# Altium footprint library Pcblib.PcbLib: 281 footprints (part 10 of 18)
Each footprint in its own frame and in the unit in brackets; x right, y up, seen from the top. Pads: shape width x height; smd on the part's side, far side on the other; paste and mask are expansions set on the pad; w line width, h text height; cw(c..) or ccw(c..) is an arc to the next point about the centre after c.
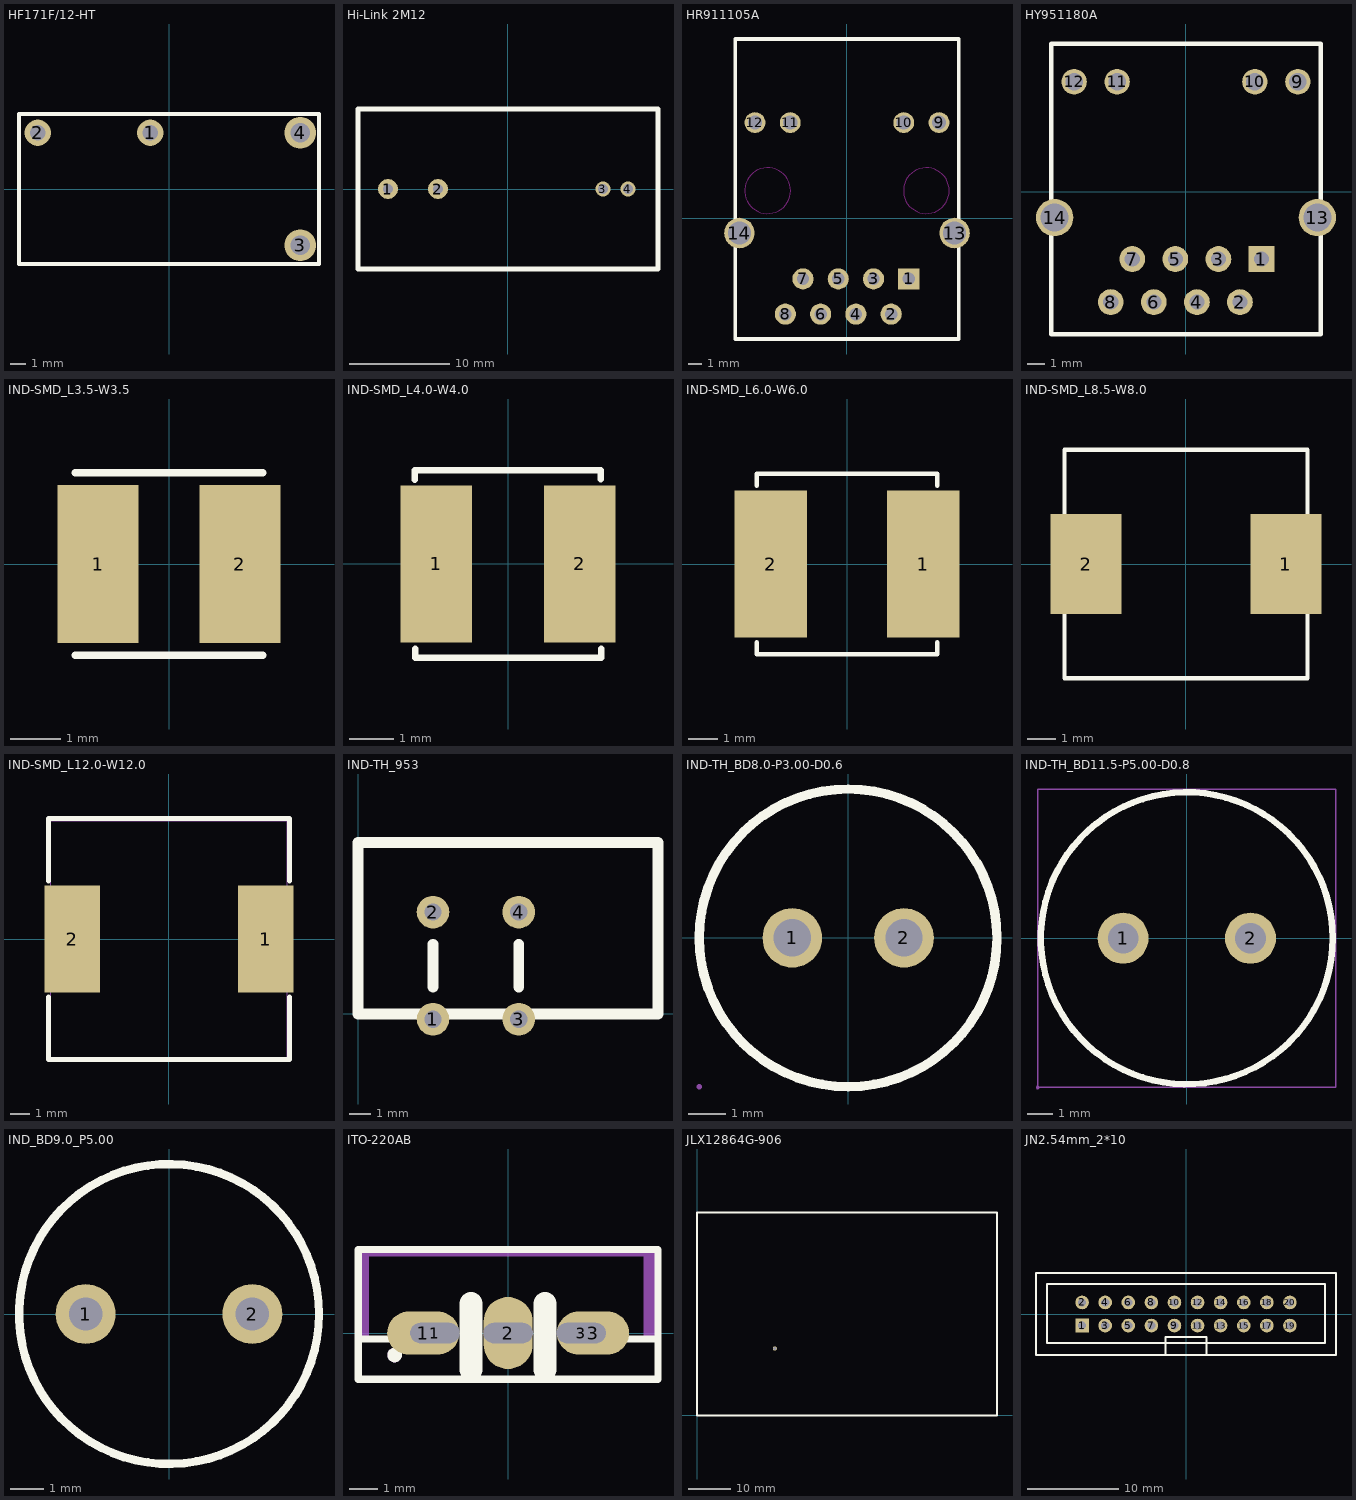
[diagram p9: the footprints below, top view; thin cyan lines are the x and y axes]

## HF171F/12-HT [mm] "8A 277AC"
pads (4):
  round 1.75 hole 1: 1(-1.25,3.75) 2(-8.75,3.75)
  round 2.1 hole 1.3: 3(8.75,-3.75) 4(8.75,3.75)
Top Overlay:
  lines w0.254: -10,-5 10,-5 10,5 -10,5 -10,-5

## Hi-Link 2M12 [mm]
height 19
pads (4):
  round 2 hole 1: 1(-12,0) 2(-7,0)
  round 1.5 hole 1: 3(9.5,0) 4(12,0)
Top Overlay:
  lines w0.508: -15,-8 15,-8 15,8 -15,8 -15,-8

## HR911105A [mm]
pads (14):
  rect 1.524x1.524 hole 0.889: 1(4.45,-4.355)
  round 1.524 hole 0.889: 2(3.18,-6.895) 3(1.91,-4.355) 4(0.64,-6.895) 5(-0.63,-4.355) 6(-1.9,-6.895) 7(-3.17,-4.355) 8(-4.44,-6.895)
  round 1.5 hole 1.02: 9(6.625,6.895) 10(4.085,6.895) 11(-4.085,6.895) 12(-6.625,6.895)
  round 2.2 hole 1.65: 13(7.745,-1.055) 14(-7.745,-1.055)
Top Overlay:
  lines w0.254: -8.05,-8.685 -8.05,12.915 8.05,12.915 8.05,-8.685 ; -7.95,-8.685 7.95,-8.685
Keep-Out Layer:
  circle w0.051: c-5.715,1.995 r1.65
  circle w0.051: c5.715,1.995 r1.65
3D body: height 0.53, standoff 0.02, extent -8.05,-8.685 8.05,12.915

## HY951180A [mm]
pads (14):
  rect 1.524x1.524 hole 0.889: 1(4.45,-3.96)
  round 1.524 hole 0.889: 2(3.18,-6.5) 3(1.91,-3.96) 4(0.64,-6.5) 5(-0.63,-3.96) 6(-1.9,-6.5) 7(-3.17,-3.96) 8(-4.44,-6.5)
  round 1.5 hole 1.02: 9(6.6,6.5) 10(4.064,6.5) 11(-4.064,6.5) 12(-6.6,6.5)
  round 2.2 hole 1.65: 13(7.75,-1.51) 14(-7.75,-1.51)
Top Overlay:
  lines w0.254: -7.95,-8.405 -7.95,8.75 7.95,8.75 7.95,-8.405 -7.95,-8.405
3D body: height 0.53, standoff 0.02, extent -7.874,-8.405 7.874,8.75

## IND-SMD_L3.5-W3.5 [mm]
pads (2):
  rect 1.6x3.12 smd: 1(-1.4,0) 2(1.4,0)
Top Overlay:
  lines w0.15: -1.85,-1.8 1.85,-1.8 ; -1.85,1.8 1.85,1.8

## IND-SMD_L4.0-W4.0 [mm]
pads (2):
  rect 1.6x3.5 smd: 1(-1.6,0) 2(1.6,0)
Top Overlay:
  lines w0.15: -2.08,1.88 -2.083,2.095 2.07,2.095 2.07,1.9 ; -2.07,-1.89 -2.07,-2.096 2.082,-2.096 2.08,-1.9

## IND-SMD_L6.0-W6.0 [mm]
pads (2):
  rect 2.474x5.02 smd: 1(2.603,0) 2(-2.603,0)
Top Overlay:
  lines w0.152: -3.076,-2.662 -3.076,-3.076 3.076,-3.076 3.076,-2.662 ; -3.076,2.662 -3.076,3.076 3.076,3.076 3.076,2.662

## IND-SMD_L8.5-W8.0 [mm]
pads (2):
  rect 2.5x3.5 smd: 1(3.5,0) 2(-3.5,0)
Top Overlay:
  lines w0.152: -4.25,-4 -4.25,4 4.25,4 4.25,-4 -4.25,-4

## IND-SMD_L12.0-W12.0 [mm]
pads (2):
  rect 2.8x5.4 smd mask+0.051: 1(4.9,0) 2(-4.9,0)
Top Overlay:
  lines w0.254: -6.096,-2.931 -6.096,-6.096 6.096,-6.096 6.096,-2.931 ; -6.096,2.931 -6.096,6.096 6.096,6.096 6.096,2.931
Mechanical 15:
  region: 6.06,6 6.06,6.025 6.025,6.06 5.975,6.06 5.94,6.025 5.94,6 5.94,5.975 5.975,5.94 6.025,5.94 6.06,5.975
  region: 6,2.1 6,-2.1 4,-2.1 4,2.1
  region: -4,2.1 -4,-2.1 -6,-2.1 -6,2.1
  lines w0.051: -6,-6 -6,6 6,6 6,-6 -6,-6

## IND-TH_953 [mm]
pads (4):
  round 1.524 hole 0.8: 1(3.5,-0.25) 2(3.5,4.75) 3(7.5,-0.25) 4(7.5,4.75)
Top Overlay:
  lines w0.504: 3.5,1.25 3.5,3.25 ; 7.5,1.25 7.5,3.25 ; 0,0 14,0 14,8 0,8 0,0

## IND-TH_BD8.0-P3.00-D0.6 [mil]
pads (2):
  round 63 hole 39.4 mask+2: 1(-59.1,0) 2(59.1,0)
Top Overlay:
  circle w10: c0,0 r157.5
Mechanical 15:
  region: -155.1,-157.5 -155.1,-156.51 -156.51,-155.1 -158.49,-155.1 -159.9,-156.51 -159.9,-157.5 -159.9,-158.49 -158.49,-159.9 -156.51,-159.9 -155.1,-158.49
  region: 70.9,0 70.9,2.35 69.1,6.68 65.78,10 61.45,11.8 56.75,11.8 52.42,10 49.1,6.68 47.3,2.35 47.3,0 47.3,-2.35 49.1,-6.68 52.42,-10 56.75,-11.8 61.45,-11.8 65.78,-10 69.1,-6.68 70.9,-2.35
  region: -47.3,0 -47.3,2.35 -49.1,6.68 -52.42,10 -56.75,11.8 -61.45,11.8 -65.78,10 -69.1,6.68 -70.9,2.35 -70.9,0 -70.9,-2.35 -69.1,-6.68 -65.78,-10 -61.45,-11.8 -56.75,-11.8 -52.42,-10 -49.1,-6.68 -47.3,-2.35
  lines w2: -157.5,0 ccw(c0,0) 0,-157.5 ccw(c0,0) 157.5,0 ccw(c0,0) 0,157.5 ccw(c0,0) -157.5,0

## IND-TH_BD11.5-P5.00-D0.8 [mm]
pads (2):
  round 2 hole 1.199 mask+0.051: 1(-2.499,0) 2(2.499,0)
Top Overlay:
  circle w0.254: c0,0 r5.725
Mechanical 15:
  region: -1.999,0 -1.999,0.1 -2.075,0.283 -2.216,0.424 -2.4,0.5 -2.599,0.5 -2.783,0.424 -2.924,0.283 -3,0.1 -3,0 -3,-0.1 -2.924,-0.283 -2.783,-0.424 -2.599,-0.5 -2.4,-0.5 -2.216,-0.424 -2.075,-0.283 -1.999,-0.1
  region: 3,0 3,0.1 2.924,0.283 2.783,0.424 2.599,0.5 2.4,0.5 2.216,0.424 2.075,0.283 1.999,0.1 1.999,0 1.999,-0.1 2.075,-0.283 2.216,-0.424 2.4,-0.5 2.599,-0.5 2.783,-0.424 2.924,-0.283 3,-0.1
  region: -5.791,-5.852 -5.791,-5.827 -5.827,-5.791 -5.877,-5.791 -5.913,-5.827 -5.913,-5.852 -5.913,-5.877 -5.877,-5.913 -5.827,-5.913 -5.791,-5.877
  lines w0.051: -5.852,-5.852 5.852,-5.852 5.852,5.852 -5.852,5.852 -5.852,-5.852

## IND_BD9.0_P5.00 [mm]
pads (2):
  round 1.8 hole 1: 1(-2.5,0) 2(2.5,0)
Top Overlay:
  circle w0.254: c0,0 r4.5

## ITO-220AB [mm]
pads (5):
  oval 2.5x1.5 all layers, no hole: 1(-2.946,0) 3(2.946,0)
  oval 1.7x0.7 hole 0.7 slot 1.7 at 0 deg: 1(-2.54,0) 3(2.54,0)
  oval 1.7x2.5 hole 0.7 slot 1.7 at 0 deg: 2(0,0)
Top Overlay:
  circle w0.254: c-3.937,-0.762 r0.127
  lines w0.254: -5.2,-0.207 -3.731,-0.207 ; -1.469,-0.207 -1.131,-0.207 ; 1.131,-0.207 1.469,-0.207 ; 3.731,-0.207 5.2,-0.207 ; -5.2,-1.6 5.2,-1.6 5.2,2.9 -5.2,2.9 -5.2,-1.6
  lines w0.8: -1.28,-1.27 -1.28,1.016 ; 1.285,-1.27 1.285,1.016
Mechanical 15:
  circle w0.254: c-3.937,-0.762 r0.127
  region: 5.08,-0.127 5.08,2.921 -5.207,2.921 -5.207,-0.127 -4.826,-0.127 -4.826,2.667 4.699,2.667 4.699,-0.127

## JLX12864G-906 [mil] "晶联讯电子"
pads (1):
  round 40 hole 32: 4(729,626)
Top Overlay:
  lines w20: 0,0 2807.09,0 2807.09,1897.64 0,1897.64 0,0

## JN2.54mm_2*10 [mm]
pads (20):
  rect 1.5x1.5 hole 0.9: 1(-11.43,-1.27)
  round 1.5 hole 0.9: 2(-11.43,1.27) 3(-8.89,-1.27) 4(-8.89,1.27) 5(-6.35,-1.27) 6(-6.35,1.27) 7(-3.81,-1.27) 8(-3.81,1.27) 9(-1.27,-1.27) 10(-1.27,1.27) 11(1.27,-1.27) 12(1.27,1.27) 13(3.81,-1.27) 14(3.81,1.27) 15(6.35,-1.27) 16(6.35,1.27) 17(8.89,-1.27) 18(8.89,1.27) 19(11.43,-1.27) 20(11.43,1.27)
Top Overlay:
  lines w0.2: -15.3,-3.2 15.3,-3.2 15.3,3.2 ; -15.3,-3.1 -15.3,3.3 15.3,3.3 ; -2.25,-4.5 -2.25,-2.54 2.25,-2.54 2.25,-4.5 ; -16.5,-4.5 -16.5,4.5 16.5,4.5 16.5,-4.5 -16.5,-4.5